# Altium footprint library Connectors Molex.PcbLib: 105 footprints (part 7 of 7)
Each footprint in its own frame and in the unit in brackets; x right, y up, seen from the top. Pads: shape width x height; smd on the part's side, far side on the other; paste and mask are expansions set on the pad; w line width, h text height; cw(c..) or ccw(c..) is an arc to the next point about the centre after c.
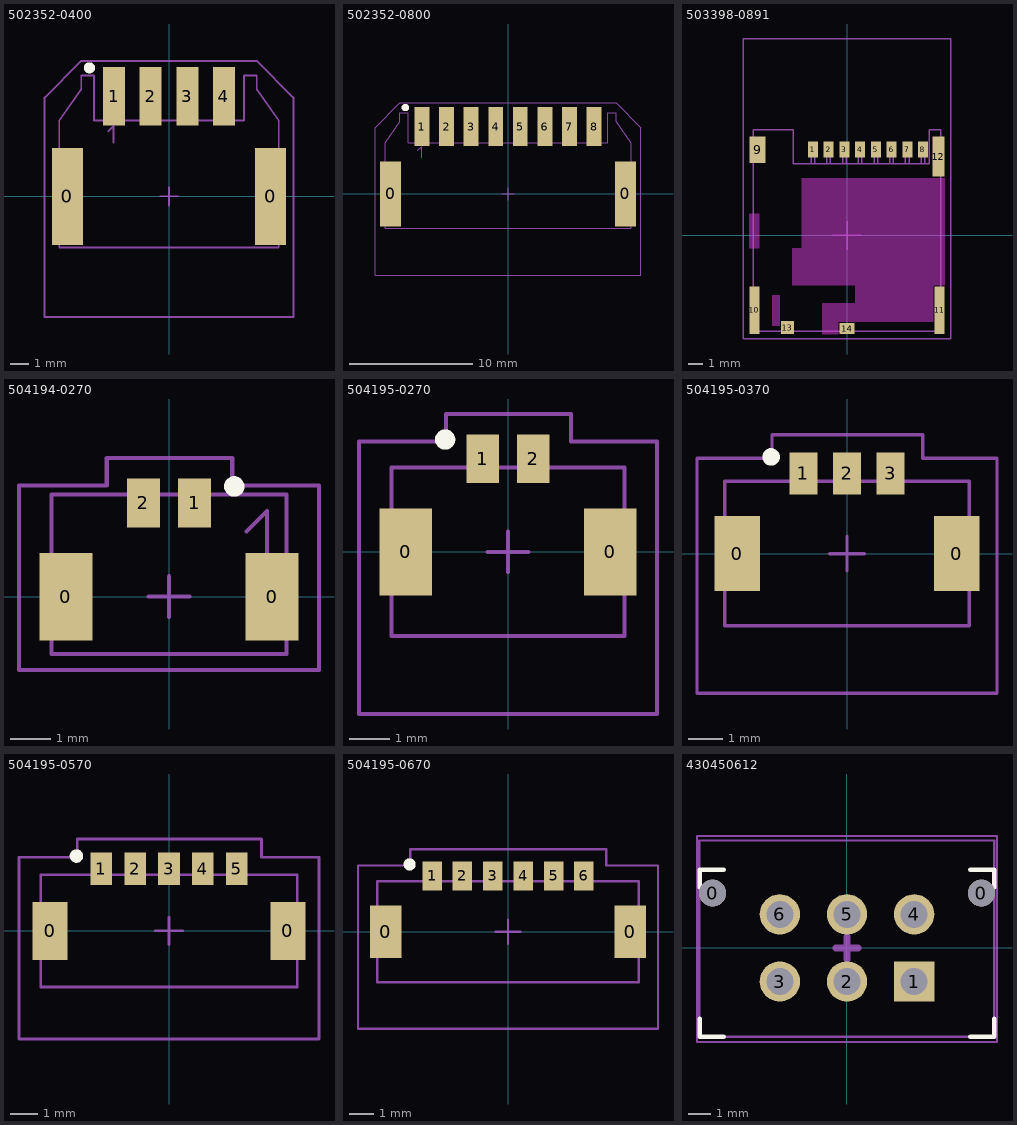
[diagram p6: the footprints below, top view; thin cyan lines are the x and y axes]

## 502352-0400 [mm] "DuraClik™ 502352"
height 6.4
pads (6):
  rect 1.7x5.3 smd: 0(-5.55,0) 0(5.55,0)
  rect 1.2x3.2 smd: 1(-3,5.48) 2(-1,5.48) 3(1,5.48) 4(3,5.48)
Top Overlay:
  circle w0.3: c-4.35,7.025 r0.15
Mechanical 13:
  lines w0.1: -3.325,3.55 -3.025,3.85 -3.025,2.95 ; -6,-2.8 -6,4.15 -4.8,5.85 -4.8,6.6 -4.1,6.6 -4.1,4.15 -3.25,4.15 -3.25,6.6 -2.75,6.6 -2.75,4.15 -1.25,4.15 -1.25,6.6 -0.75,6.6 -0.75,4.15 0.75,4.15 0.75,6.6 1.25,6.6 1.25,4.15 2.75,4.15 2.75,6.6 3.25,6.6 3.25,4.15 4.1,4.15 4.1,6.6 4.8,6.6 4.8,5.85 6,4.15 6,-2.8 -6,-2.8
  text ".Designator" at -1.3,0.3 h1.5
Mechanical 15:
  lines w0.1: -0.5,0 0.5,0 ; 0,-0.5 0,0.5 ; -4.8,7.4 -4.8,7.4 ; -4.8,7.4 -6.8,5.4 -6.8,-6.6 6.8,-6.6 6.8,5.4 4.8,7.4 ; -4.8,7.4 4.8,7.4 ; 4.8,7.4 4.8,7.4
3D body "5023520400.stp": height 6.4, standoff 0, extent -6,-2.8 6,6.6

## 502352-0800 [mm] "DuraClik™ 502352"
height 6.4
pads (10):
  rect 1.7x5.3 smd: 0(-9.55,0) 0(9.55,0)
  rect 1.2x3.2 smd: 1(-7,5.48) 2(-5,5.48) 3(-3,5.48) 4(-1,5.48) 5(1,5.48) 6(3,5.48) 7(5,5.48) 8(7,5.48)
Top Overlay:
  circle w0.3: c-8.35,7.025 r0.15
Mechanical 13:
  lines w0.1: -7.325,3.55 -7.025,3.85 -7.025,2.95 ; -10,-2.8 -10,4.15 -8.8,5.85 -8.8,6.6 -8.1,6.6 -8.1,4.15 -7.25,4.15 -7.25,6.6 -6.75,6.6 -6.75,4.15 -5.25,4.15 -5.25,6.6 -4.75,6.6 -4.75,4.15 -3.25,4.15 -3.25,6.6 -2.75,6.6 -2.75,4.15 -1.25,4.15 -1.25,6.6 -0.75,6.6 -0.75,4.15 0.75,4.15 0.75,6.6 1.25,6.6 1.25,4.15 2.75,4.15 2.75,6.6 3.25,6.6 3.25,4.15 4.75,4.15 4.75,6.6 5.25,6.6 5.25,4.15 6.75,4.15 6.75,6.6 7.25,6.6 7.25,4.15 8.1,4.15 8.1,6.6 8.8,6.6 8.8,5.85 10,4.15 10,-2.8 -10,-2.8
  text ".Designator" at -1.3,0.3 h1.5
Mechanical 15:
  lines w0.1: -0.5,0 0.5,0 ; 0,-0.5 0,0.5 ; -8.8,7.4 -8.8,7.4 ; -8.8,7.4 -10.8,5.4 -10.8,-6.6 10.8,-6.6 10.8,5.4 8.8,7.4 ; -8.8,7.4 8.8,7.4 ; 8.8,7.4 8.8,7.4
3D body "5023520800.stp": height 6.4, standoff 0, extent -10,-2.8 10,6.6

## 503398-0891 [mm] "MICRO SD CARD PUSH-PUSH R/A"
height 1.28
pads (14):
  rect 0.7x1.1 smd: 1(-2.38,6.015) 2(-1.28,6.015) 3(-0.18,6.015) 4(0.92,6.015) 5(2.02,6.015) 6(3.12,6.015) 7(4.22,6.015) 8(5.32,6.015)
  rect 1.14x1.83 smd: 9(-6.26,6)
  rect 0.7x3.33 smd: 10(-6.48,-5.25) 11(6.48,-5.25)
  rect 0.86x2.8 smd: 12(6.4,5.515)
  rect 0.9x0.93 smd: 13(-4.17,-6.45)
  rect 1.05x0.78 smd: 14(0.01,-6.525)
Top Layer keep-out:
  region: -1.73,-6.915 -1.73,-4.735 0.57,-4.735 0.57,-3.485 -3.82,-3.485 -3.82,-0.885 -3.17,-0.885 -3.17,4 6.83,4 6.83,-3.485 6.025,-3.485 6.025,-6.025 -0.625,-6.025 -0.625,-6.915
  region: -6.83,-0.885 -6.13,-0.885 -6.13,1.515 -6.83,1.515
  region: -5.235,-6.335 -4.725,-6.335 -4.725,-4.185 -5.235,-4.185
Mechanical 13:
  lines w0.1: -2.5,5 -2.5,6.25 -2.25,6.25 -2.25,5 ; -1.405,5 -1.405,6.25 -1.155,6.25 -1.155,5 ; -0.305,5 -0.305,6.25 -0.055,6.25 -0.055,5 ; 0.795,5 0.795,6.25 1.045,6.25 1.045,5 ; 1.895,5 1.895,6.25 2.145,6.25 2.145,5 ; 2.995,5 2.995,6.25 3.245,6.25 3.245,5 ; 4.095,5 4.095,6.25 4.345,6.25 4.345,5 ; 5.195,5 5.195,6.25 5.445,6.25 5.445,5 ; -6.55,-6.71 6.55,-6.71 6.55,7.39 5.75,7.39 5.75,5 -3.75,5 -3.75,7.39 -6.55,7.39 -6.55,-6.71
  text ".Designator" at -3.6,-0.45 h1.5
Mechanical 15:
  lines w0.1: -1,0 1,0 ; 0.01,-0.99 0.01,1 ; -7.25,-7.25 -7.25,13.75 7.25,13.75 7.25,-7.25 -7.25,-7.25
3D body "5033980891.stp": height 1.27, standoff -0.01, extent -6.55,-6.78 6.55,7.39

## 504194-0270 [mm] "Micro-Lock™ 504194"
height 4.2
pads (4):
  rect 1.3x2.15 smd: 0(-2.525,0) 0(2.525,0)
  rect 0.8x1.2 smd: 1(0.625,2.295) 2(-0.625,2.295)
Top Overlay:
  lines w0.25: 1.725,2.7 cw(c1.6,2.7) 1.725,2.705
Mechanical 13:
  lines w0.1: 1.9,1.6 2.4,2.1 2.4,0.35 ; -2.875,-1.4 -2.875,2.5 2.875,2.5 2.875,-1.4 -2.875,-1.4
  text ".Designator" at -1.525,-0.3 h1.5
Mechanical 15:
  lines w0.1: -0.5,0 0.5,0 ; 0,-0.5 0,0.5 ; -3.675,-1.8 -3.675,2.725 -1.525,2.725 -1.525,3.4 1.55,3.4 1.55,2.725 3.675,2.725 3.675,-1.8 -3.675,-1.8
3D body "5055680271.stp": height 4.2, standoff 0, extent -2.875,-1.405 2.875,2.505

## 504195-0270 [mm] "Micro-Lock™ 504195-0270"
height 3.9
pads (4):
  rect 1.3x2.15 smd: 0(-2.525,0) 0(2.525,0)
  rect 0.8x1.2 smd: 1(-0.625,2.295) 2(0.625,2.295)
Top Overlay:
  circle w0.25: c-1.55,2.77 r0.125
Mechanical 13:
  lines w0.1: -2.545,0.41 -2.045,0.91 -2.045,-0.84 ; -2.875,-2.075 2.875,-2.075 2.875,2.075 -2.875,2.075 -2.875,-2.075
  text ".Designator" at -1.525,-0.3 h1.5
Mechanical 15:
  lines w0.1: -0.5,0 0.5,0 ; 0,-0.5 0,0.5 ; -3.675,-4 3.675,-4 3.675,2.725 1.55,2.725 1.55,3.4 -1.525,3.4 -1.525,2.725 -3.675,2.725 -3.675,-4
3D body "5041950270.stp": height 3.9, standoff 0, extent -2.875,-2.05 2.875,2.1

## 504195-0370 [mm] "Micro-Lock™ 504195-0370"
height 3.9
pads (5):
  rect 1.3x2.15 smd: 0(-3.15,0) 0(3.15,0)
  rect 0.8x1.2 smd: 1(-1.25,2.295) 2(0,2.295) 3(1.25,2.295)
Top Overlay:
  circle w0.25: c-2.175,2.77 r0.125
Mechanical 13:
  lines w0.1: -3.17,0.415 -2.67,0.915 -2.67,-0.835 ; -3.5,-2.075 -3.5,2.075 3.5,2.075 3.5,-2.075 -3.5,-2.075
  text ".Designator" at -2,-0.35 h1.5
Mechanical 15:
  lines w0.1: -0.5,0 0.5,0 ; 0,-0.5 0,0.5 ; -4.3,-4 -4.3,2.725 -2.15,2.725 -2.15,3.4 2.175,3.4 2.175,2.725 4.3,2.725 4.3,-4 -4.3,-4
3D body "5041950370.stp": height 3.9, standoff 0, extent -3.5,-2.05 3.5,2.1

## 504195-0570 [mm] "Micro-Lock™ 504195-0570"
height 3.9
pads (7):
  rect 1.3x2.15 smd: 0(-4.4,0) 0(4.4,0)
  rect 0.8x1.2 smd: 1(-2.5,2.295) 2(-1.25,2.295) 3(0,2.295) 4(1.25,2.295) 5(2.5,2.295)
Top Overlay:
  circle w0.25: c-3.425,2.77 r0.125
Mechanical 13:
  lines w0.1: -4.42,0.415 -3.92,0.915 -3.92,-0.835 ; -4.75,-2.075 4.75,-2.075 4.75,2.075 -4.75,2.075 -4.75,-2.075
  text ".Designator" at -2,-0.35 h1.5
Mechanical 15:
  lines w0.1: -0.5,0 0.5,0 ; 0,-0.5 0,0.5 ; -5.55,-4 5.55,-4 5.55,2.725 3.425,2.725 3.425,3.4 -3.4,3.4 -3.4,2.725 -5.55,2.725 -5.55,-4
3D body "5041950570.stp": height 3.9, standoff 0, extent -4.75,-2.05 4.75,2.1

## 504195-0670 [mm] "Micro-Lock™ 504195-0670"
height 3.9
pads (8):
  rect 1.3x2.15 smd: 0(-5.025,0) 0(5.025,0)
  rect 0.8x1.2 smd: 1(-3.125,2.295) 2(-1.875,2.295) 3(-0.625,2.295) 4(0.625,2.295) 5(1.875,2.295) 6(3.125,2.295)
Top Overlay:
  circle w0.25: c-4.05,2.77 r0.125
Mechanical 13:
  lines w0.1: -5.045,0.415 -4.545,0.915 -4.545,-0.835 ; -5.375,-2.075 5.375,-2.075 5.375,2.075 -5.375,2.075 -5.375,-2.075
  text ".Designator" at -2,-0.35 h1.5
Mechanical 15:
  lines w0.1: -0.5,0 0.5,0 ; 0,-0.5 0,0.5 ; -6.175,-4 6.175,-4 6.175,2.725 4.05,2.725 4.05,3.4 -4.025,3.4 -4.025,2.725 -6.175,2.725 -6.175,-4
3D body "5041950670.stp": height 3.9, standoff 0, extent -5.375,-2.05 5.375,2.1

## 430450612 [mm] "Micro-Fit 3.0™ 43045"
height 9.91
pads (8):
  round 1.2 hole 1.2 unplated: 0(-6,2.45) 0(6,2.45)
  rect 1.8x1.8 hole 1.2: 1(3,-1.5)
  round 1.8 hole 1.2: 2(0,-1.5) 3(-3,-1.5) 4(3,1.5) 5(0,1.5) 6(-3,1.5)
Top Overlay:
  lines w0.2: -6.575,-3.17 -6.575,-3.97 ; -6.575,2.7 -6.575,3.5 ; -5.5,-3.97 -6.575,-3.97 ; -5.5,3.5 -6.575,3.5 ; 5.5,-3.97 6.575,-3.97 ; 5.5,3.5 6.575,3.5 ; 6.575,-3.17 6.575,-3.97 ; 6.575,2.7 6.575,3.5 ; -6.575,-3.97 -6.575,-3.97 ; -6.575,3.5 -6.575,3.5 ; 6.575,-3.97 6.575,-3.97 ; 6.575,3.5 6.575,3.5
Mechanical 13:
  lines w0.1: -6.6,-3.97 -6.6,4.8 6.575,4.8 6.575,-3.97 -6.6,-3.97
Mechanical 15:
  lines w0.1: -6.7,-4.2 -6.7,5 6.7,5 6.7,-4.2 -6.7,-4.2
  lines w0.3: -0.5,0 0.5,0 ; 0,-0.5 0,0.5
3D body "430450612.stp": height 9.95, standoff -3.14, extent -6.575,-3.94 6.575,4.83